# Altium footprint library Amirreza.PcbLib: 524 footprints (part 19 of 33)
Each footprint in its own frame and in the unit in brackets; x right, y up, seen from the top. Pads: shape width x height; smd on the part's side, far side on the other; paste and mask are expansions set on the pad; w line width, h text height; cw(c..) or ccw(c..) is an arc to the next point about the centre after c.
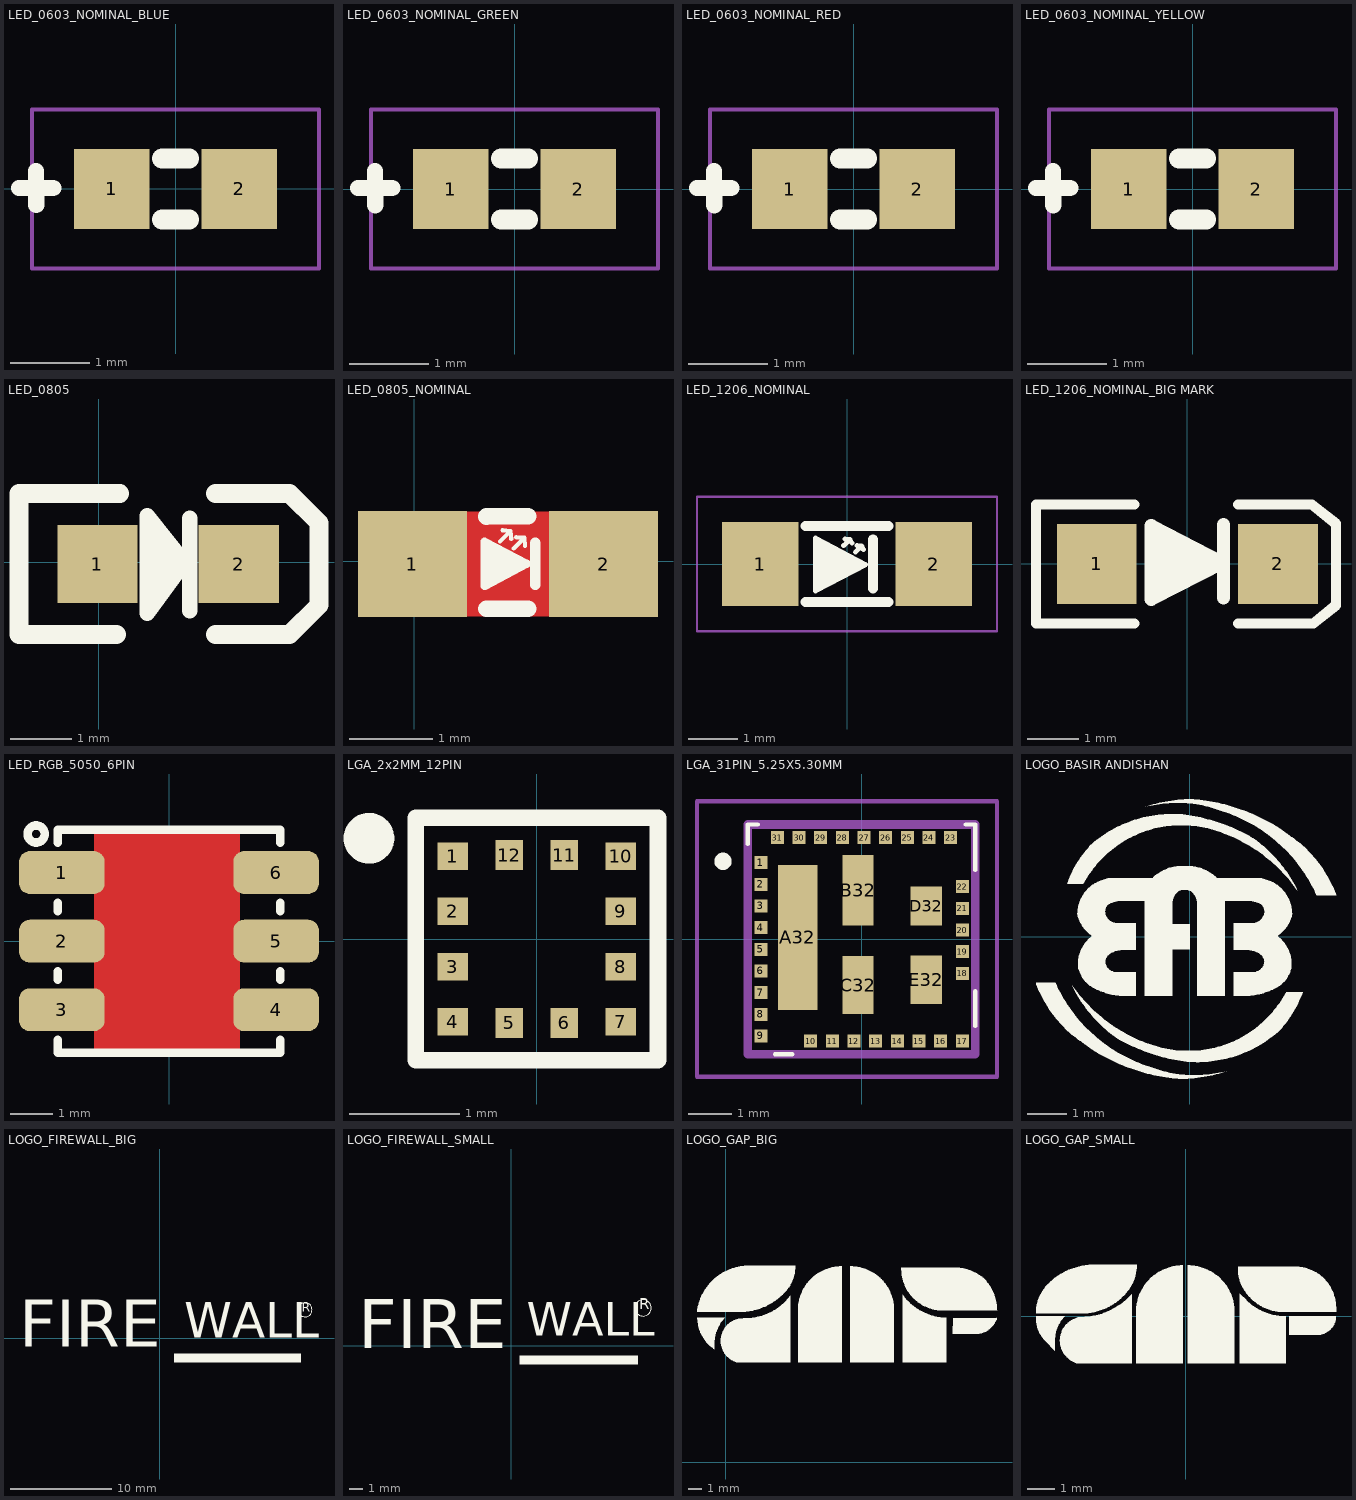
[diagram p18: the footprints below, top view; thin cyan lines are the x and y axes]

## LED_0603_NOMINAL_BLUE [mm]
pads (2):
  rect 0.95x1 smd: 1(-0.8,0) 2(0.8,0)
Top Overlay:
  lines w0.203: -1.966,0.012 -1.536,0.013 ; -1.751,0.227 -1.75,-0.203
  lines w0.25: -0.171,-0.381 0.171,-0.381 ; -0.171,0.381 0.171,0.381
Mechanical 13:
  lines w0.05: -1.8,-1 1.8,-1 1.8,1 -1.8,1 -1.8,-1
3D body "User Library-LED_0603_B.STEP": height 0.63, standoff 0.02, extent -0.8,-0.4 0.8,0.4

## LED_0603_NOMINAL_GREEN [mm]
pads (2):
  rect 0.95x1 smd: 1(-0.8,0) 2(0.8,0)
Top Overlay:
  lines w0.203: -1.966,0.012 -1.536,0.013 ; -1.751,0.227 -1.75,-0.203
  lines w0.25: -0.171,-0.381 0.171,-0.381 ; -0.171,0.381 0.171,0.381
Mechanical 13:
  lines w0.05: -1.8,-1 1.8,-1 1.8,1 -1.8,1 -1.8,-1
3D body "User Library-LED_0603_G.STEP": height 0.63, standoff 0.02, extent -0.8,-0.4 0.8,0.4

## LED_0603_NOMINAL_RED [mm]
pads (2):
  rect 0.95x1 smd: 1(-0.8,0) 2(0.8,0)
Top Overlay:
  lines w0.203: -1.966,0.012 -1.536,0.013 ; -1.751,0.227 -1.75,-0.203
  lines w0.25: -0.171,-0.381 0.171,-0.381 ; -0.171,0.381 0.171,0.381
Mechanical 13:
  lines w0.05: -1.8,-1 -1.8,1 1.8,1 1.8,-1 -1.8,-1
3D body "User Library-LED_0603_R.STEP": height 0.63, standoff 0.02, extent -0.8,-0.4 0.8,0.4

## LED_0603_NOMINAL_YELLOW [mm]
pads (2):
  rect 0.95x1 smd: 1(-0.8,0) 2(0.8,0)
Top Overlay:
  lines w0.203: -1.966,0.012 -1.536,0.013 ; -1.751,0.227 -1.75,-0.203
  lines w0.25: -0.171,-0.381 0.171,-0.381 ; -0.171,0.381 0.171,0.381
Mechanical 13:
  lines w0.05: -1.8,-1 1.8,-1 1.8,1 -1.8,1 -1.8,-1
3D body "User Library-LED_0603_Y.STEP": height 0.63, standoff 0.02, extent -0.8,-0.4 0.8,0.4

## LED_0805 [mm]
pads (2):
  rect 1.3x1.27 smd: 1(-0.02,-0.03) 2(2.266,-0.03)
Top Overlay:
  region: 1.086,0.369 0.787,0.667 0.787,-0.724 1.384,-0.127 1.384,-0.008
  lines w0.254: 0.787,-0.825 1.384,-0.008 0.787,0.746 0.787,-0.813 ; 1.473,-0.787 1.473,0.711
  lines w0.305: 0.29,-1.173 -1.29,-1.173 -1.29,1.113 0.341,1.113 ; 1.891,-1.173 3.089,-1.173 3.567,-0.695 3.567,0.635 3.089,1.113 1.891,1.113

## LED_0805_NOMINAL [mm]
pads (2):
  rect 1.3x1.27 smd: 1(-0.02,-0.03) 2(2.266,-0.03)
Top Layer:
  pour cut-out: 0.63,0.595 0.63,-0.655 1.616,-0.655 1.616,0.595
Top Overlay:
  region: 0.842,0.239 1.346,-0.027 0.842,-0.293
  lines w0.051: 1.027,0.239 1.154,0.366 ; 1.058,0.374 1.154,0.366 ; 1.162,0.269 1.154,0.366 ; 1.192,0.156 1.319,0.283 ; 1.222,0.291 1.319,0.283 ; 1.327,0.186 1.319,0.283
  lines w0.1: 0.842,-0.293 1.346,-0.027 0.842,0.239 0.842,-0.293
  lines w0.127: 1.447,-0.276 1.448,0.221
  lines w0.2: 0.867,-0.564 1.365,-0.565 ; 0.867,0.539 1.365,0.54
3D body "User Library-User Library-led_0805 GRE.step": height 1.1, standoff 0, extent 0.092,-0.625 2.112,0.625

## LED_1206_NOMINAL [mm]
pads (2):
  rect 1.54x1.7 smd: 1(-1.75,0) 2(1.75,0)
Top Overlay:
  region: -0.634,0.521 -0.634,-0.011 0.373,-0.011
  region: -0.634,-0.543 -0.634,-0.011 0.373,-0.011
  lines w0.1: -0.068,0.37 0.059,0.497 ; -0.037,0.506 0.059,0.497 ; 0.096,0.423 0.059,0.497 ; 0.168,0.237 0.295,0.364 ; 0.198,0.372 0.295,0.364 ; 0.332,0.289 0.295,0.364 ; -0.634,-0.543 0.373,-0.011 -0.634,0.521 -0.634,-0.011 -0.634,-0.543
  lines w0.2: -0.837,-0.763 0.84,-0.763 ; -0.837,0.761 0.84,0.761 ; 0.521,-0.496 0.521,0.498
Mechanical 13:
  lines w0.05: -3.02,-1.35 3.02,-1.35 3.02,1.35 -3.02,1.35 -3.02,-1.35
3D body "User Library-LED 1206 BLUE.step": height 1.1, standoff 0, extent -1.6,-0.8 1.6,0.8

## LED_1206_NOMINAL_BIG MARK [mm]
pads (2):
  rect 1.54x1.54 smd: 1(-1.75,0) 2(1.75,0)
Top Overlay:
  rectangle: -0.697,-0.077 0.451,0.147
  region: -0.599,0.779 -0.788,0.51 0.177,-0.169 0.366,0.101
  region: -0.762,-0.312 -0.587,-0.638 0.452,-0.079 0.277,0.247
  rectangle: -0.697,-0.378 -0.105,0.483
  lines w0.2: -1.023,-1.15 -2.923,-1.15 -2.923,1.15 -1.023,1.15 ; 0.977,-1.15 2.43,-1.15 2.87,-0.798 2.87,0.777 2.404,1.15 0.977,1.15
  lines w0.254: 0.7,-0.655 0.7,0.766 ; -0.697,-0.68 0.686,0.025 -0.697,0.741 -0.697,-0.68
3D body "User Library-LED 1206 BLUE.step": height 1.1, standoff 0, extent -1.6,-0.8 1.6,0.8

## LED_RGB_5050_6PIN [mm] "LED 5mmX5mm, PLLC6"
pads (6):
  rrect50% 2x1 smd mask+0.1: 1(-2.5,1.6) 2(-2.5,0) 3(-2.5,-1.6) 4(2.5,-1.6) 5(2.5,0) 6(2.5,1.6)
Top Layer:
  pour cut-out: -1.75,2.54 1.65,2.54 1.65,-2.54 -1.75,-2.54
Top Overlay:
  circle w0.2: c-3.1,2.5 r0.2
  lines w0.2: -2.6,-2.3 -2.6,-2.6 2.6,-2.6 2.6,-2.3 ; -2.6,-0.9 -2.6,-0.7 ; -2.6,0.7 -2.6,0.9 ; -2.6,2.3 -2.6,2.6 2.6,2.6 2.6,2.3 ; 2.6,-0.9 2.6,-0.7 ; 2.6,0.7 2.6,0.9
3D body "User Library-APA102C_RGB.step": height 1.55, standoff 0, extent -2.75,-2.5 2.75,2.5

## LGA_2x2MM_12PIN [mm]
pads (12):
  rect 0.275x0.25 smd: 1(-0.762,0.75) 2(-0.762,0.25) 3(-0.762,-0.25) 4(-0.762,-0.75) 7(0.763,-0.75) 8(0.763,-0.25) 9(0.763,0.25) 10(0.763,0.75)
  rect 0.25x0.275 smd: 5(-0.25,-0.762) 6(0.25,-0.762) 11(0.25,0.763) 12(-0.25,0.763)
Top Overlay:
  circle w0.26: c-1.524,0.914 r0.1
  lines w0.152: -1.1,-1.1 1.1,-1.1 1.1,1.1 -1.1,1.1 -1.1,-1.1
3D body "User Library-lga-2x2x0_9.step": height 0.95, standoff 0, extent -1,-1 1,1

## LGA_31PIN_5.25X5.30MM [mm] "0.73mm LGA package"
pads (36):
  rect 0.3x0.3 smd: 1(-2.325,1.77) 2(-2.325,1.27) 3(-2.325,0.77) 4(-2.325,0.27) 5(-2.325,-0.23) 6(-2.325,-0.73) 7(-2.325,-1.23) 8(-2.325,-1.73) 9(-2.325,-2.23) 10(-1.176,-2.35) 11(-0.676,-2.35) 12(-0.176,-2.35) 13(0.324,-2.35) 14(0.824,-2.35) 15(1.324,-2.35) 16(1.824,-2.35) 17(2.324,-2.35) 18(2.324,-0.785) 19(2.324,-0.285) 20(2.324,0.215) 21(2.324,0.715) 22(2.324,1.215) 23(2.055,2.35) 24(1.555,2.35) 25(1.055,2.35) 26(0.555,2.35) 27(0.055,2.35) 28(-0.445,2.35) 29(-0.945,2.35) 30(-1.445,2.35) 31(-1.945,2.35)
  rect 0.905x3.343 smd: A32(-1.473,0.043)
  rect 0.706x1.635 smd: B32(-0.083,1.133)
  rect 0.706x1.341 smd: C32(-0.083,-1.055)
  rect 0.735x0.9 smd: D32(1.493,0.765)
  rect 0.735x1.12 smd: E32(1.493,-0.933)
Top Overlay:
  lines w0.1: -2.625,2.2 -2.625,2.65 -2.4,2.65 ; -2,-2.65 -1.6,-2.65 ; 2.4,2.65 2.625,2.65 2.625,1.6 ; 2.625,-2 2.625,-1.2
  lines w0.2: -3.2,1.7 cw(c-3.2,1.8) -3.2,1.9 cw(c-3.2,1.8) -3.2,1.7
Top Assembly:
  lines w0.2: -2.625,-2.65 2.625,-2.65 2.625,2.65 -2.625,2.65 -2.625,-2.65
Mechanical 13:
  lines w0.1: -3.8,-3.17 -3.8,3.185 3.125,3.185 3.125,-3.17 -3.8,-3.17
3D body "RF7198.stp": height 0.83, standoff 0, extent -2.625,-2.65 2.625,2.65

## LOGO_BASIR ANDISHAN [mm]
Top Overlay:
  drawing of 9 lines, arcs and shapes, not listed

## LOGO_FIREWALL_BIG [mm]
Top Overlay:
  circle w0.076: c14.43,2.809 r0.695
  rectangle: 1.397,-2.413 14.022,-1.546
  text "R" at 14.097,2.311 h1.52
  text "FIRE" at -13.97,-2.413 h8
  text "WALL" at 2.419,-1.092 h6

## LOGO_FIREWALL_SMALL [mm]
Top Overlay:
  circle w0.076: c9.931,2.845 r0.61
  rectangle: 0.635,-1.422 9.549,-0.735
  text "R" at 9.652,2.438 h1.4
  text "FIRE" at -11.506,-1.422 h6.35
  text "WALL" at 1.198,-0.089 h4.32

## LOGO_GAP_BIG [mm]
Top Overlay:
  drawing of 9 lines, arcs and shapes, not listed

## LOGO_GAP_SMALL [mm]
Top Overlay:
  drawing of 9 lines, arcs and shapes, not listed